# Altium footprint library Connectors.PcbLib: 164 footprints (part 5 of 11)
Each footprint in its own frame and in the unit in brackets; x right, y up, seen from the top. Pads: shape width x height; smd on the part's side, far side on the other; paste and mask are expansions set on the pad; w line width, h text height; cw(c..) or ccw(c..) is an arc to the next point about the centre after c.
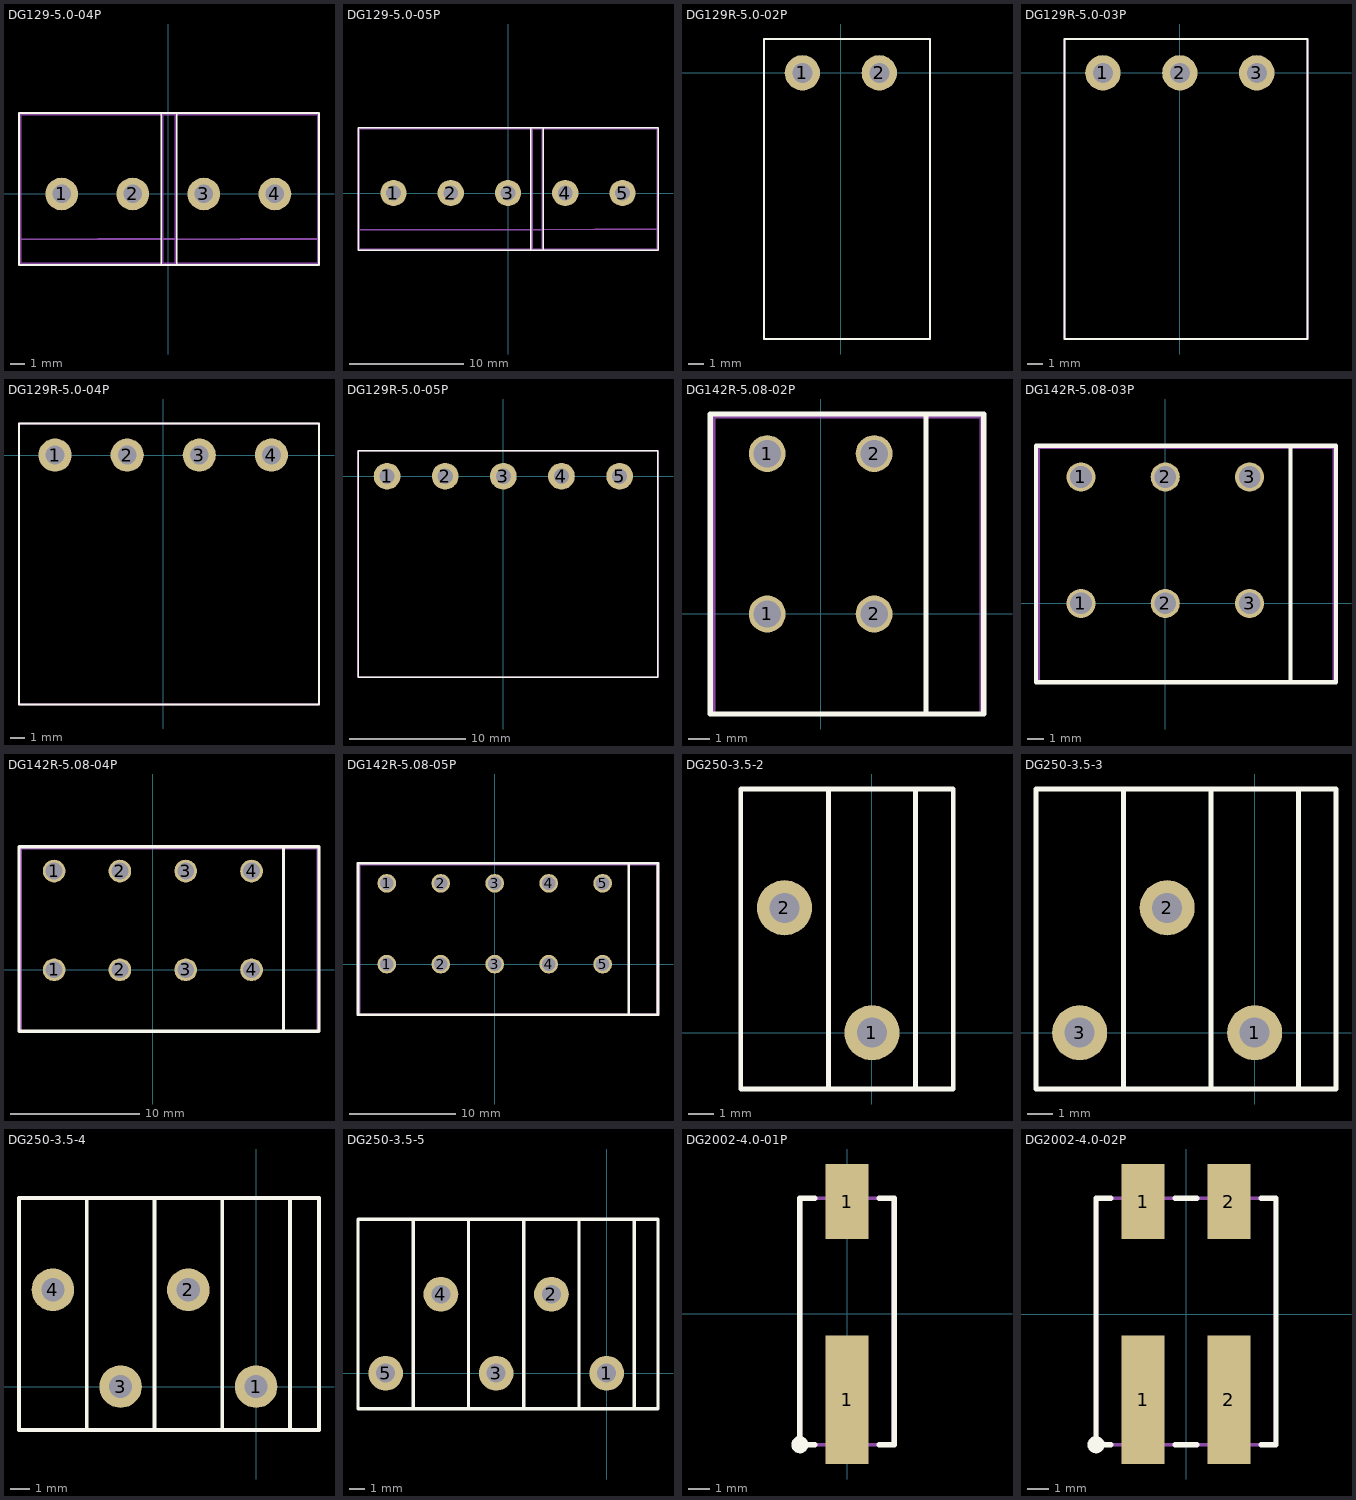
[diagram p4: the footprints below, top view; thin cyan lines are the x and y axes]

## DG129-5.0-04P [mm]
height 19.5
pads (4):
  round 2.3 hole 1.3: 1(-7.5,0) 2(-2.5,0) 3(2.5,0) 4(7.5,0)
Top Overlay:
  lines w0.127: -10.5,-5 -10.5,5.7 0.6,5.7 0.6,-5 -10.5,-5 ; -0.5,-5 10.6,-5 10.6,5.7 -0.5,5.7 -0.5,-5
Mechanical 15:
  lines w0.15: -10.4,-3.2 0.5,-3.148 ; -0.4,-3.2 10.5,-3.148 ; -10.4,-4.9 -10.4,5.6 0.528,5.6 0.528,-4.9 -10.4,-4.9 ; -0.4,-4.9 10.528,-4.9 10.528,5.6 -0.4,5.6 -0.4,-4.9
3D body "DG129-5.0-02P-1Y-100AH.STEP": height 19.55, standoff -3.9, extent -0.55,-4.9 10.55,5.6
3D body "DG129-5.0-02P-1Y-100AH.STEP": height 19.55, standoff -3.9, extent -10.55,-4.9 0.55,5.6

## DG129-5.0-05P [mm]
height 19.5
pads (5):
  round 2.3 hole 1.3: 1(-10,0) 2(-5,0) 3(0,0) 4(5,0) 5(10,0)
Top Overlay:
  lines w0.127: -13.1,-5 -13.1,5.7 3.1,5.7 3.1,-5 -13.1,-5 ; 2,-5 13.1,-5 13.1,5.7 2,5.7 2,-5
Mechanical 15:
  lines w0.15: -13,-3.2 3,-3.2 ; 2.1,-3.2 13,-3.148 ; -13,-4.9 -13,5.6 3,5.6 3,-4.9 -13,-4.9 ; 2.1,-4.9 13.028,-4.9 13.028,5.6 2.1,5.6 2.1,-4.9
3D body "DG129-5.0-03P-1Y-100AH.STEP": height 19.55, standoff -3.9, extent -13.05,-4.9 3.05,5.6
3D body "DG129-5.0-02P-1Y-100AH.STEP": height 19.55, standoff -3.9, extent 1.95,-4.9 13.05,5.6

## DG129R-5.0-02P [mm]
height 10.5
pads (2):
  round 2.3 hole 1.3: 1(-2.5,0) 2(2.5,0)
Top Overlay:
  lines w0.127: -5,-17.3 -5,2.2 5.8,2.2 5.8,-17.3 -5,-17.3
Mechanical 15:
  lines w0.15: -5,-17.3 5.8,-17.3 5.8,2.2 -5,2.2 -5,-17.3
3D body "DG129R-5.0-02P-1Y-00AH.STEP": height 10.55, standoff -5.35, extent -5,-17.3 5.55,2.2

## DG129R-5.0-03P [mm]
height 10.5
pads (3):
  round 2.3 hole 1.3: 1(-5,0) 2(0,0) 3(5,0)
Top Overlay:
  lines w0.127: -7.5,-17.3 8.3,-17.3 8.3,2.2 -7.5,2.2 -7.5,-17.3
Mechanical 15:
  lines w0.15: -7.5,-17.3 -7.5,2.2 8.3,2.2 8.3,-17.3 -7.5,-17.3
3D body "DG129R-5.0-03P-1Y-00AH.STEP": height 10.55, standoff -5.35, extent -7.55,-17.35 8,2.15

## DG129R-5.0-04P [mm]
height 10.5
pads (4):
  round 2.3 hole 1.3: 1(-7.5,0) 2(-2.5,0) 3(2.5,0) 4(7.5,0)
Top Overlay:
  lines w0.127: -10,-17.3 10.8,-17.3 10.8,2.2 -10,2.2 -10,-17.3
Mechanical 15:
  lines w0.15: 0,-17.3 10.8,-17.3 10.8,2.2 0,2.2 ; 0.8,-17.3 -10,-17.3 -10,2.2 0.8,2.2
3D body "DG129R-5.0-02P-1Y-00AH.STEP": height 10.55, standoff -5.35, extent -10,-17.3 0.55,2.2
3D body "DG129R-5.0-02P-1Y-00AH.STEP": height 10.55, standoff -5.35, extent 0,-17.3 10.55,2.2

## DG129R-5.0-05P [mm]
height 10.5
pads (5):
  round 2.3 hole 1.3: 1(-10,0) 2(-5,0) 3(0,0) 4(5,0) 5(10,0)
Top Overlay:
  lines w0.127: -12.5,-17.3 13.3,-17.3 13.3,2.2 -12.5,2.2 -12.5,-17.3
Mechanical 15:
  lines w0.15: -12.5,-17.3 -12.5,2.2 13.3,2.2 13.3,-17.3 -12.5,-17.3
3D body "DG129R-5.0-05P-1Y-00AH.STEP": height 10.55, standoff -5.35, extent -12.54,-17.3 13.01,2.2

## DG142R-5.08-02P [mm]
height 13.4
pads (4):
  round 1.75 hole 1.3: 1(-2.54,0) 1(-2.54,7.62) 2(2.54,0) 2(2.54,7.62)
Top Overlay:
  lines w0.25: 5,-4.75 5,9.5 ; -5.25,-4.75 7.75,-4.75 7.75,9.5 -5.25,9.5 -5.25,-4.75
Mechanical 15:
  lines w0.15: -5.08,-4.73 -5.08,9.37 7.62,9.37 7.62,-4.73 -5.08,-4.73
3D body "DG142R-5.08-02P-1Y-00A(H).STEP": height 13.5, standoff -3.4, extent -5.1,-4.7 7.6,9.402

## DG142R-5.08-03P [mm]
height 13.4
pads (6):
  round 1.75 hole 1.3: 1(-5.08,0) 1(-5.08,7.62) 2(0,0) 2(0,7.62) 3(5.08,0) 3(5.08,7.62)
Top Overlay:
  lines w0.25: 7.54,-4.75 7.54,9.5 ; -7.79,-4.75 10.29,-4.75 10.29,9.5 -7.79,9.5 -7.79,-4.75
Mechanical 15:
  lines w0.15: -7.62,-4.73 -7.62,9.37 10.16,9.37 10.16,-4.73 -7.62,-4.73
3D body "DG142R-5.08-03P-1Y-00A(H).STEP": height 13.5, standoff -3.4, extent -7.62,-4.699 10.16,9.403

## DG142R-5.08-04P [mm]
height 13.4
pads (8):
  round 1.75 hole 1.3: 1(-7.62,0) 1(-7.62,7.62) 2(-2.54,0) 2(-2.54,7.62) 3(2.54,0) 3(2.54,7.62) 4(7.62,0) 4(7.62,7.62)
Top Overlay:
  lines w0.25: 10.08,-4.75 10.08,9.5 ; -10.33,-4.75 12.83,-4.75 12.83,9.5 -10.33,9.5 -10.33,-4.75
Mechanical 15:
  lines w0.15: -10.16,-4.73 -10.16,9.37 12.7,9.37 12.7,-4.73 -10.16,-4.73
3D body "DG142R-5.08-04P-1Y-00A(H).STEP": height 13.5, standoff -3.4, extent -10.16,-4.704 12.7,9.398

## DG142R-5.08-05P [mm]
height 13.4
pads (10):
  round 1.75 hole 1.3: 1(-10.16,0) 1(-10.16,7.62) 2(-5.08,0) 2(-5.08,7.62) 3(0,0) 3(0,7.62) 4(5.08,0) 4(5.08,7.62) 5(10.16,0) 5(10.16,7.62)
Top Overlay:
  lines w0.25: 12.62,-4.75 12.62,9.5 ; -12.87,-4.75 15.37,-4.75 15.37,9.5 -12.87,9.5 -12.87,-4.75
Mechanical 15:
  lines w0.15: -12.7,-4.73 -12.7,9.37 15.24,9.37 15.24,-4.73 -12.7,-4.73
3D body "DG142R-5.08-05P-1Y-00A(H).STEP": height 13.5, standoff -3.4, extent -12.7,-4.704 15.24,9.398

## DG250-3.5-2 [mm]
height 13
pads (2):
  round 2.2 hole 1.2: 1(0,0) 2(-3.5,5)
Top Overlay:
  lines w0.2: -1.75,-2.25 -1.75,9.75 ; 1.75,-2.25 1.75,9.75 ; -5.25,-2.25 3.25,-2.25 3.25,9.75 -5.25,9.75 -5.25,-2.25
3D body "DG250-3.5-02.STEP": height 13.4, standoff -3.3, extent -5.3,-2.3 3.2,9.7

## DG250-3.5-3 [mm]
height 13
pads (3):
  round 2.2 hole 1.2: 1(0,0) 2(-3.5,5) 3(-7,0)
Top Overlay:
  lines w0.2: -5.25,-2.25 -5.25,9.75 ; -1.75,-2.25 -1.75,9.75 ; 1.75,-2.25 1.75,9.75 ; -8.75,-2.25 -8.75,9.75 3.25,9.75 3.25,-2.25 -8.75,-2.25
3D body "DG250-3.5-03.STEP": height 13.4, standoff -3.3, extent -8.7,-2.3 3.3,9.7

## DG250-3.5-4 [mm]
height 13
pads (4):
  round 2.2 hole 1.2: 1(0,0) 2(-3.5,5) 3(-7,0) 4(-10.5,5)
Top Overlay:
  lines w0.2: -8.75,-2.25 -8.75,9.75 ; -5.25,-2.25 -5.25,9.75 ; -1.75,-2.25 -1.75,9.75 ; 1.75,-2.25 1.75,9.75 ; -12.25,-2.25 -12.25,9.75 3.25,9.75 3.25,-2.25 -12.25,-2.25
3D body "DG250-3.5-04.STEP": height 13.4, standoff -3.3, extent -12.3,-2.3 3.2,9.7

## DG250-3.5-5 [mm]
height 13
pads (5):
  round 2.2 hole 1.2: 1(0,0) 2(-3.5,5) 3(-7,0) 4(-10.5,5) 5(-14,0)
Top Overlay:
  lines w0.2: -12.25,-2.25 -12.25,9.75 ; -8.75,-2.25 -8.75,9.75 ; -5.25,-2.25 -5.25,9.75 ; -1.75,-2.25 -1.75,9.75 ; 1.75,-2.25 1.75,9.75 ; -15.75,-2.25 3.25,-2.25 3.25,9.75 -15.75,9.75 -15.75,-2.25
3D body "DG250-3.5-05.STEP": height 13.4, standoff -3.3, extent -15.8,-2.3 3.2,9.7

## DG2002-4.0-01P [mm]
height 4
pads (2):
  rect 2x6 smd: 1(0,-4)
  rect 2x3.5 smd: 1(0,5.25)
Top Overlay:
  circle w0.3: c-2.2,-6.1 r0.25
  lines w0.25: -1.5,-6.1 -2.2,-6.1 -2.2,5.4 -1.5,5.4 ; 1.5,-6.1 2.2,-6.1 2.2,5.4 1.5,5.4
Mechanical 15:
  lines w0.15: -2.15,-6.1 2.15,-6.1 2.15,5.4 -2.15,5.4 -2.15,-6.1
3D body "DG2002-4.0-01P-11-100A.STEP": height 4.05, standoff 0, extent -2.15,-6.234 2.15,6.866

## DG2002-4.0-02P [mm]
height 4
pads (4):
  rect 2x6 smd: 1(-2,-4) 2(2,-4)
  rect 2x3.5 smd: 1(-2,5.25) 2(2,5.25)
Top Overlay:
  circle w0.3: c-4.2,-6.1 r0.25
  lines w0.25: -3.5,-6.1 -4.2,-6.1 -4.2,5.4 -3.5,5.4 ; -0.5,-6.1 0.5,-6.1 ; -0.5,5.4 0.5,5.4 ; 3.5,-6.1 4.2,-6.1 4.2,5.4 3.5,5.4
Mechanical 15:
  lines w0.15: -4.15,-6.1 -4.15,5.4 4.15,5.4 4.15,-6.1 -4.15,-6.1
3D body "DG2002-4.0-02P-11-100A.STEP": height 4.05, standoff 0, extent -4.15,-6.25 4.15,6.85